# Altium footprint library LED.PcbLib: 60 footprints (part 1 of 4)
Each footprint in its own frame and in the unit in brackets; x right, y up, seen from the top. Pads: shape width x height; smd on the part's side, far side on the other; paste and mask are expansions set on the pad; w line width, h text height; cw(c..) or ccw(c..) is an arc to the next point about the centre after c.
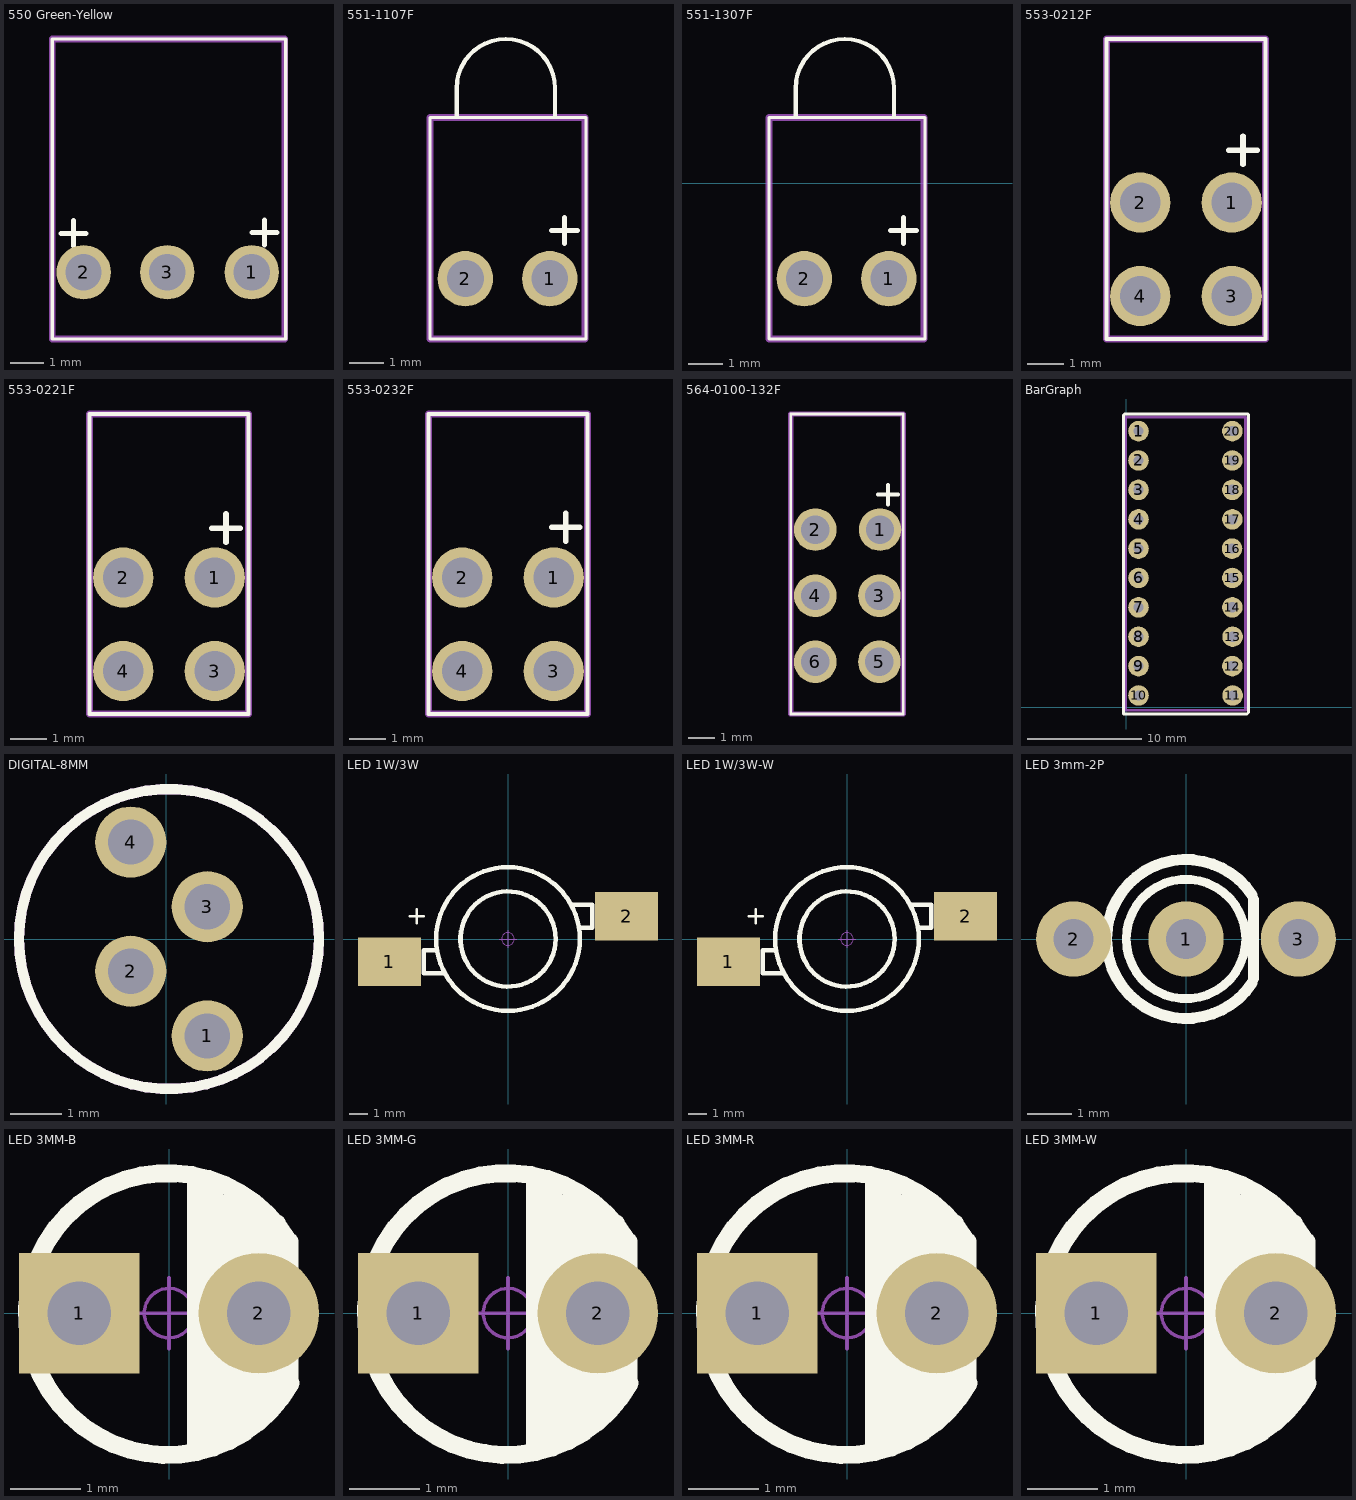
[diagram p0: the footprints below, top view; thin cyan lines are the x and y axes]

## 550 Green-Yellow [mm] "LED 3mm Right Angle - Yellow Green"
pads (3):
  round 1.635 hole 1.09: 1(11.252,9.804) 2(6.198,9.804) 3(8.712,9.804)
Top Overlay:
  lines w0.1: 5.258,7.798 5.258,16.815 12.271,16.815 12.271,7.798 5.258,7.798
  lines w0.15: 5.512,10.973 6.274,10.973 ; 5.893,10.592 5.893,11.354 ; 11.252,10.998 12.014,10.998 ; 11.633,10.617 11.633,11.379
Mechanical 13:
  lines w0.2: 5.258,7.798 12.243,7.798 12.243,16.815 5.258,16.815 5.258,7.798

## 551-1107F [mm] "LED 3mm Right Angle - Color Red"
pads (2):
  round 1.635 hole 1.09: 1(11.201,9.576) 2(8.712,9.576)
Top Overlay:
  lines w0.1: 7.671,7.798 12.271,7.798 12.271,14.326 7.671,14.326 7.671,7.798
  lines w0.127: 8.456,15.189 cw(c9.906,15.189) 11.356,15.189 ; 8.458,14.364 8.458,15.197 ; 11.356,14.364 11.356,15.151
  lines w0.15: 11.252,10.998 12.014,10.998 ; 11.633,10.617 11.633,11.379
Mechanical 13:
  lines w0.2: 7.671,7.798 7.671,14.326 12.243,14.326 12.243,7.798 7.671,7.798
3D body "User Library-Lumex_SSF-LXH103ID.STEP": height 7.4, standoff -3.18, extent 7.671,7.798 12.271,16.698

## 551-1307F [mm] "LED 3mm Right Angle - Color Green"
height 3.5
pads (2):
  round 1.635 hole 1.09: 1(-7.239,-2.819) 2(-9.728,-2.819)
Top Overlay:
  lines w0.1: -10.77,-4.597 -10.77,1.93 -6.17,1.93 -6.17,-4.597 -10.77,-4.597
  lines w0.127: -9.984,2.794 cw(c-8.534,2.794) -7.084,2.794 ; -9.982,1.968 -9.982,2.802 ; -7.084,1.968 -7.084,2.756
  lines w0.15: -7.188,-1.397 -6.426,-1.397 ; -6.807,-1.778 -6.807,-1.016
Mechanical 13:
  lines w0.2: -10.77,-4.597 -6.198,-4.597 -6.198,1.93 -10.77,1.93 -10.77,-4.597
3D body "LEDd3YC-Green.STEP": height 7.31, standoff -2.49, extent -10.82,-4.481 -6.198,4.278

## 553-0212F [mm] "LED 3mm Right Angle - Red Green"
pads (4):
  round 1.635 hole 1.09: 1(-266.827,86.919) 2(-269.316,86.919) 3(-266.827,84.379) 4(-269.316,84.379)
Top Overlay:
  lines w0.1: -270.23,83.21 -270.23,91.364 -265.913,91.364 -265.913,83.21 -270.23,83.21
  lines w0.15: -266.903,88.341 -266.141,88.341 ; -266.522,87.96 -266.522,88.722
Mechanical 13:
  lines w0.2: -270.23,83.21 -265.913,83.21 -265.913,91.364 -270.23,91.364 -270.23,83.21
3D body "User Library-553-0212F.STEP": height 9.65, standoff -3.68, extent -270.281,83.185 -265.963,94.183

## 553-0221F [mm] "LED 3mm Right Angle - Green Red"
pads (4):
  round 1.635 hole 1.09: 1(-266.827,86.919) 2(-269.316,86.919) 3(-266.827,84.379) 4(-269.316,84.379)
Top Overlay:
  lines w0.1: -270.23,83.21 -270.23,91.364 -265.913,91.364 -265.913,83.21 -270.23,83.21
  lines w0.15: -266.903,88.265 -266.141,88.265 ; -266.522,87.884 -266.522,88.646
Mechanical 13:
  lines w0.2: -270.23,83.21 -265.913,83.21 -265.913,91.364 -270.23,91.364 -270.23,83.21
3D body "User Library-553-0221F.STEP": height 9.65, standoff -3.68, extent -270.23,83.312 -265.913,94.31

## 553-0232F [mm] "LED 3mm Right Angle - Yellow Green"
pads (4):
  round 1.635 hole 1.09: 1(-266.827,86.919) 2(-269.316,86.919) 3(-266.827,84.379) 4(-269.316,84.379)
Top Overlay:
  lines w0.1: -270.23,83.21 -265.913,83.21 -265.913,91.364 -270.23,91.364 -270.23,83.21
  lines w0.15: -266.878,88.29 -266.116,88.29 ; -266.497,87.909 -266.497,88.671
Mechanical 13:
  lines w0.2: -270.23,83.21 -270.23,91.364 -265.913,91.364 -265.913,83.21 -270.23,83.21
3D body "User Library-553-0232F.STEP": height 9.65, standoff -3.68, extent -270.231,83.223 -265.913,94.221

## 564-0100-132F [mm] "LED 3mm Right Angle - Red Yello Green"
pads (6):
  round 1.635 hole 1.09: 1(-266.802,90.297) 2(-269.291,90.297) 3(-266.827,87.757) 4(-269.291,87.757) 5(-266.827,85.217) 6(-269.291,85.217)
Top Overlay:
  lines w0.1: -270.23,83.21 -270.23,94.742 -265.913,94.742 -265.913,83.21 -270.23,83.21
  lines w0.15: -266.878,91.643 -266.116,91.643 ; -266.497,91.262 -266.497,92.024
Mechanical 13:
  lines w0.2: -270.23,83.21 -265.913,83.21 -265.913,94.742 -270.23,94.742 -270.23,83.21
3D body "User Library-Dialight 564-0100-132F.STEP": height 15.35, standoff -2.95, extent -270.272,83.336 -265.872,97.436

## BarGraph [mm] "LED Bar Graph"
height 10
pads (20):
  round 1.8 hole 0.9: 1(1.092,24.232) 2(1.092,21.655) 3(1.092,19.078) 4(1.092,16.485) 5(1.092,13.925) 6(1.092,11.348) 7(1.092,8.771) 8(1.092,6.195) 9(1.092,3.618) 10(1.092,1.041) 11(9.347,1.041) 12(9.322,3.618) 13(9.347,6.195) 14(9.322,8.771) 15(9.322,11.348) 16(9.296,13.925) 17(9.322,16.485) 18(9.322,19.078) 19(9.322,21.655) 20(9.322,24.232)
Top Overlay:
  lines w0.254: -0.229,-0.584 10.617,-0.584 10.744,-0.457 10.744,25.679 10.693,25.73 -0.127,25.73 -0.229,25.629 -0.229,-0.584
Mechanical 1:
  lines w0.254: -0.025,-0.254 -0.025,25.476 10.49,25.476 10.49,-0.254 -0.025,-0.254
3D body "BarGraph.STEP": height 10, standoff -3.2, extent 0.127,-0.125 10.327,25.375

## DIGITAL-8MM [mm]
pads (4):
  round 1.4 hole 0.889: 1(0.805,-1.905) 2(-0.703,-0.635) 3(0.805,0.635) 4(-0.703,1.905)
Top Overlay:
  circle w0.2: c0.051,0 r2.95
Mechanical 13:
  circle w0.2: c0.051,0 r2.95
3D body "step_temp.STEP": height 9.6, standoff -26.5, extent -2.449,-2.947 3.001,2.947

## LED 1W/3W [mm] "ï¿½ï¿½ï¿½ï¿½LED"
pads (2):
  rect 3.5x2.7 smd: 1(-6.604,-1.27) 2(6.604,1.27)
Top Overlay:
  circle w0.254: c0,0 r2.65
  circle w0.254: c0,0 r4
  lines w0.15: -5.461,1.27 -4.699,1.27 ; -5.08,0.889 -5.08,1.651
  lines w0.254: -4.064,-0.635 -4.699,-0.635 -4.699,-1.905 -3.556,-1.905 ; 3.556,1.905 4.699,1.905 4.699,0.635 4.064,0.635
Mechanical 15:
  circle w0.05: c0,0 r0.35
  lines w0.05: -0.5,0 0.5,0 ; 0,-0.5 0,0.5
3D body "LED 1W ͸����.STEP": height 5.26, standoff 2.46, extent -2.745,-2.745 2.745,2.745
3D body "LED 1W ����-��ɫ.STEP": height 3.65, standoff 0.04, extent -7.2,-4 7.2,4

## LED 1W/3W-W [mm] "ï¿½ï¿½É«ï¿½ï¿½ï¿½ï¿½ï¿½ï¿½LED"
pads (2):
  rect 3.5x2.7 smd: 1(-6.604,-1.27) 2(6.604,1.27)
Top Overlay:
  circle w0.254: c0,0 r2.65
  circle w0.254: c0,0 r4
  lines w0.15: -5.461,1.27 -4.699,1.27 ; -5.08,0.889 -5.08,1.651
  lines w0.254: -4.064,-0.635 -4.699,-0.635 -4.699,-1.905 -3.556,-1.905 ; 3.556,1.905 4.699,1.905 4.699,0.635 4.064,0.635
Mechanical 15:
  circle w0.05: c0,0 r0.35
  lines w0.05: -0.5,0 0.5,0 ; 0,-0.5 0,0.5
3D body "LED 1W ͸����.STEP": height 5.26, standoff 2.46, extent -2.745,-2.745 2.745,2.745
3D body "LED 1W ����.STEP": height 3.65, standoff 0.04, extent -7.2,-4 7.2,4

## LED 3mm-2P [mm] "3mmË«É«LED"
height 5
pads (3):
  round 1.7 hole 0.9: 1(0,0) 2(-2.54,0) 3(2.54,0)
Top Overlay:
  circle w0.2: c0,0 r1.35
  lines w0.254: 1.494,-0.996 cw(c0,0) 1.494,0.996 ; 1.524,-0.889 1.524,0.889
3D body "3MM ˫ɫLED.STEP": height 3.82, standoff -3.15, extent -2.79,-0.75 2.79,0.75
3D body "˫ɫLED-����.STEP": height 6.9, standoff 1.4, extent -1.95,-1.95 1.696,1.95

## LED 3MM-B [mm] "ï¿½ï¿½É«3mmÖ±ï¿½ï¿½LED"
height 6.35
pads (2):
  rect 1.7x1.7 hole 0.9: 1(-1.27,0)
  round 1.7 hole 0.9: 2(1.27,0)
Top Overlay:
  lines w0.254: 0.381,-1.905 0.381,1.905 ; 0.635,-1.778 0.635,1.778 ; 1.016,-1.651 1.016,1.524 ; 1.524,1.27 1.524,-1.27 1.27,-1.524 1.27,1.397 1.143,1.524 1.016,1.524 ; 1.685,1.025 ccw(c-0.016,-0.012) 1.72,-0.987 ; 1.702,-0.965 1.702,1.016 ; 0.889,1.651 1.016,1.524 ; 0.889,1.651 0.889,-1.778 0.889,1.651
Mechanical 15:
  circle w0.05: c0,0 r0.35
  lines w0.05: -0.5,0 0.5,0 ; 0,-0.5 0,0.5
3D body "LED 3mm-B.STEP": height 3, standoff -3.45, extent -1.623,-0.838 1.618,0.838
3D body "LED 3mm-������.STEP": height 5.55, standoff 0.05, extent -1.95,-1.95 1.638,1.95

## LED 3MM-G [mm] "ï¿½ï¿½É«3mmÖ±ï¿½ï¿½LED"
height 6.35
pads (2):
  rect 1.7x1.7 hole 0.9: 1(-1.27,0)
  round 1.7 hole 0.9: 2(1.27,0)
Top Overlay:
  lines w0.254: 0.381,-1.905 0.381,1.905 ; 0.635,-1.778 0.635,1.778 ; 1.016,-1.651 1.016,1.524 ; 1.524,1.27 1.524,-1.27 1.27,-1.524 1.27,1.397 1.143,1.524 1.016,1.524 ; 1.685,1.025 ccw(c-0.016,-0.012) 1.72,-0.987 ; 1.702,-0.965 1.702,1.016 ; 0.889,1.651 1.016,1.524 ; 0.889,1.651 0.889,-1.778 0.889,1.651
Mechanical 15:
  circle w0.05: c0,0 r0.35
  lines w0.05: -0.5,0 0.5,0 ; 0,-0.5 0,0.5
3D body "LED 3mm-G.STEP": height 3.01, standoff -3.45, extent -1.623,-0.838 1.618,0.838
3D body "LED 3mm-������.STEP": height 5.55, standoff 0.05, extent -1.95,-1.95 1.638,1.95

## LED 3MM-R [mm] "ï¿½ï¿½É«3mmÖ±ï¿½ï¿½LED"
height 6.35
pads (2):
  rect 1.7x1.7 hole 0.9: 1(-1.27,0)
  round 1.7 hole 0.9: 2(1.27,0)
Top Overlay:
  lines w0.254: 0.381,-1.905 0.381,1.905 ; 0.635,-1.778 0.635,1.778 ; 1.016,-1.651 1.016,1.524 ; 1.524,1.27 1.524,-1.27 1.27,-1.524 1.27,1.397 1.143,1.524 1.016,1.524 ; 1.685,1.025 ccw(c-0.016,-0.012) 1.72,-0.987 ; 1.702,-0.965 1.702,1.016 ; 0.889,1.651 0.889,-1.778 0.889,1.651 ; 0.889,1.651 1.016,1.524
Mechanical 15:
  circle w0.05: c0,0 r0.35
  lines w0.05: -0.5,0 0.5,0 ; 0,-0.5 0,0.5
3D body "LED 3mm-R.STEP": height 3.01, standoff -3.45, extent -1.623,-0.838 1.618,0.838
3D body "LED 3mm-������.STEP": height 5.55, standoff 0.05, extent -1.95,-1.95 1.638,1.95

## LED 3MM-W [mm] "ï¿½ï¿½É«3mmÖ±ï¿½ï¿½LED"
height 6.35
pads (2):
  rect 1.7x1.7 hole 0.9: 1(-1.27,0)
  round 1.7 hole 0.9: 2(1.27,0)
Top Overlay:
  lines w0.254: 0.381,-1.905 0.381,1.905 ; 0.635,-1.778 0.635,1.778 ; 1.016,-1.651 1.016,1.524 ; 1.524,1.27 1.524,-1.27 1.27,-1.524 1.27,1.397 1.143,1.524 1.016,1.524 ; 1.685,1.025 ccw(c-0.016,-0.012) 1.72,-0.987 ; 1.702,-0.965 1.702,1.016 ; 0.889,1.651 0.889,-1.778 0.889,1.651 ; 0.889,1.651 1.016,1.524
Mechanical 15:
  circle w0.05: c0,0 r0.35
  lines w0.05: -0.5,0 0.5,0 ; 0,-0.5 0,0.5
3D body "LED 3mm-������.STEP": height 5.55, standoff 0.05, extent -1.95,-1.95 1.638,1.95
3D body "LED 3mm-W.STEP": height 2.56, standoff -3.45, extent -1.623,-0.838 1.618,0.838